# Altium footprint library BluetoothAdapter.PcbLib: 39 footprints (part 2 of 3)
Each footprint in its own frame and in the unit in brackets; x right, y up, seen from the top. Pads: shape width x height; smd on the part's side, far side on the other; paste and mask are expansions set on the pad; w line width, h text height; cw(c..) or ccw(c..) is an arc to the next point about the centre after c.
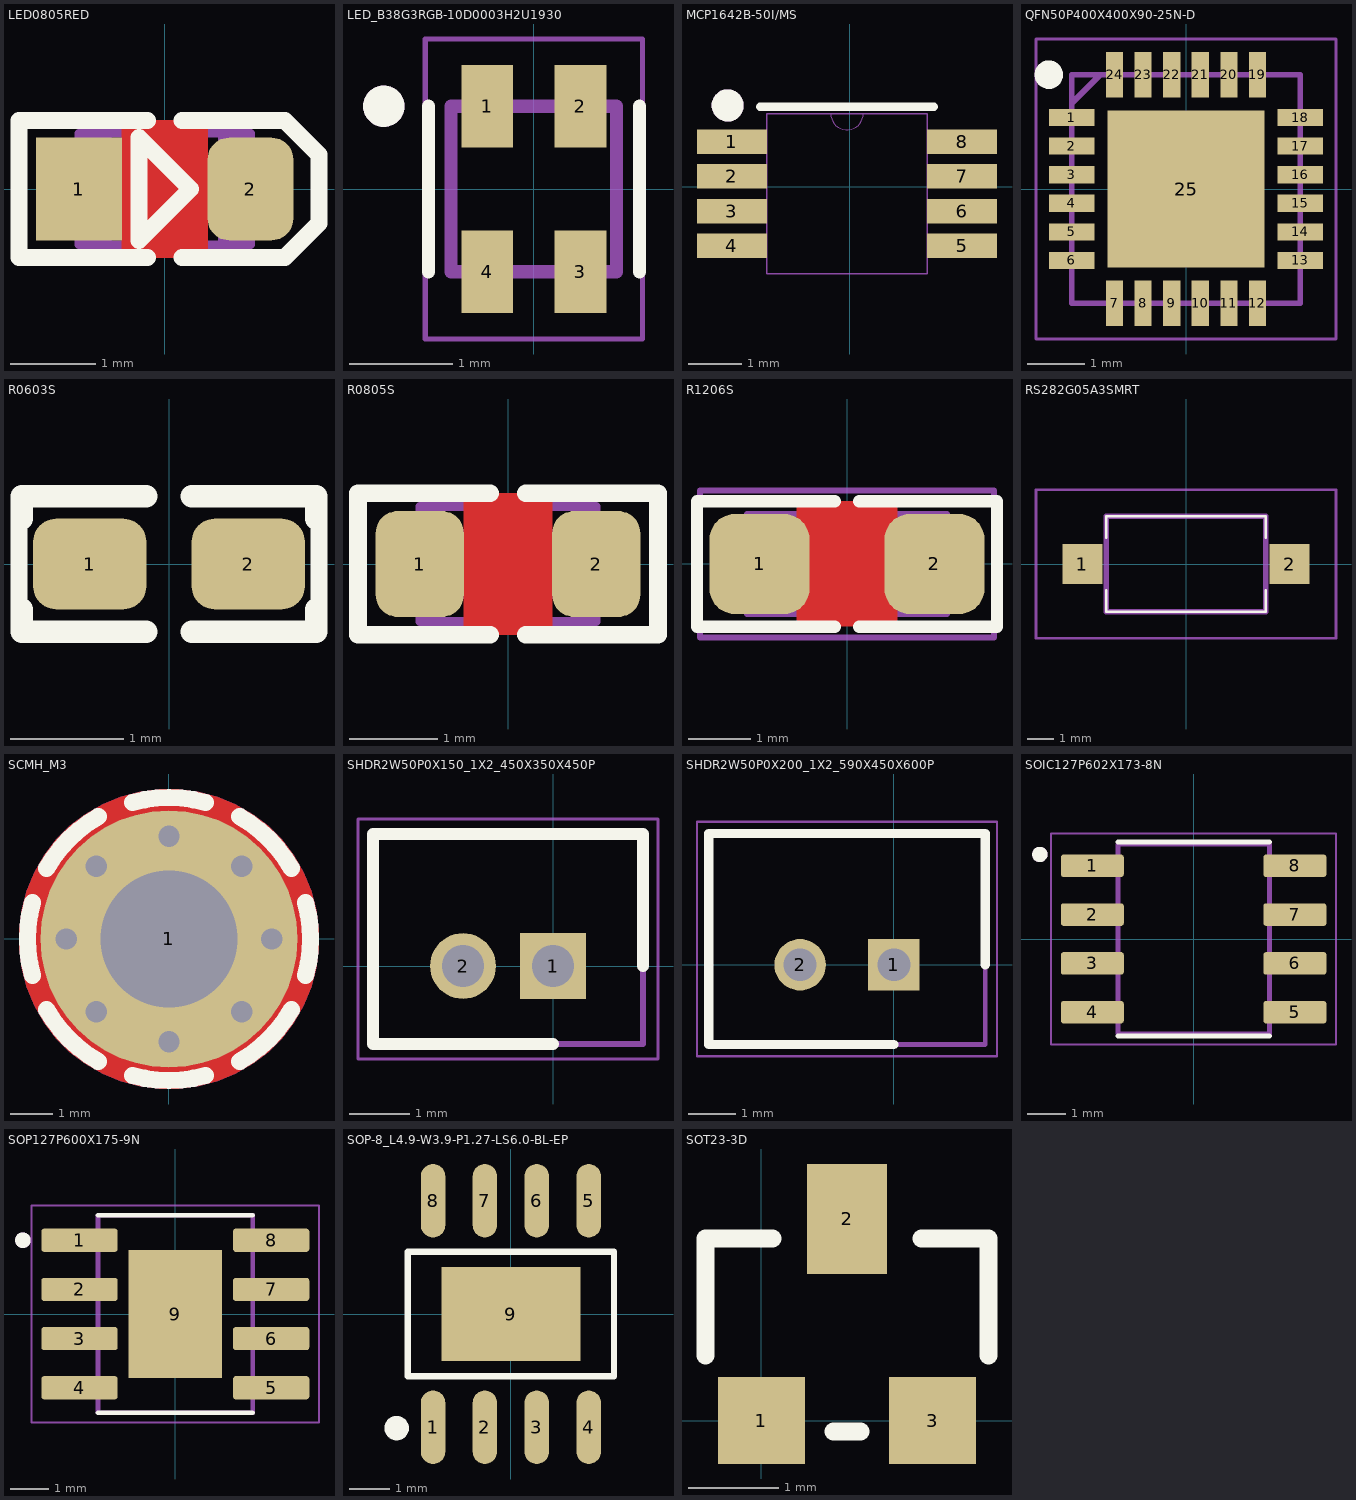
[diagram p1: the footprints below, top view; thin cyan lines are the x and y axes]

## LED0805RED [mm] "LED SMD 0805, RED"
height 1.4
pads (2):
  rect 1x1.2 smd mask+0.075: 1(-1,0)
  rrect50% 1x1.2 smd mask+0.075: 2(1,0)
Top Layer:
  pour cut-out: -0.5,0.8 0.5,0.8 0.5,-0.8 -0.5,-0.8
Top Overlay:
  lines w0.2: -0.2,-0.8 -1.7,-0.8 -1.7,0.8 -0.2,0.8 ; 0.2,-0.8 1.4,-0.8 1.8,-0.4 1.8,0.4 1.4,0.8 0.2,0.8 ; -0.3,-0.6 0.3,0 -0.3,0.6 -0.3,-0.6
Mechanical 13:
  region: 0.995,-0.191 0.842,-0.191 0.842,-0.65 0.995,-0.65
  region: 0.995,0.65 0.842,0.65 0.842,0.19 0.995,0.19
  region: 0.848,0.65 0.619,0.65 0.619,-0.65 0.848,-0.65
  rectangle: -0.995,-0.65 -0.842,-0.19
  rectangle: -0.995,0.191 -0.842,0.65
  rectangle: -0.848,-0.65 -0.619,0.65
  lines w0.102: -0.305,0.356 -0.076,0.025 -0.33,0 -0.076,-0.33 ; 0.102,0.356 0.33,0.025 0.076,0 0.33,-0.33 ; -0.076,-0.33 -0.229,-0.279 -0.076,-0.178 -0.076,-0.33 ; 0.33,-0.33 0.178,-0.279 0.33,-0.178 0.33,-0.33 ; -1,-0.65 -1,-0.191 ccw(c-1,0) -1,0.191 -1,0.65 1,0.65 1,0.191 ccw(c1,0) 1,-0.191 1,-0.65 -1,-0.65
3D body "User Library-Wurth Elektronik WL-SMCW 0805 (2012) LED Lens (Separate Body).step": height 0.7, standoff 0.3, extent -0.7,-0.625 0.7,0.625
3D body "User Library-Wurth Elektronik WL-SMCW 0805 (2012) LED Base (Separate Lens).step": height 0.64, standoff 0, extent -1,-0.625 1,0.625

## LED_B38G3RGB-10D0003H2U1930 [mm]
pads (4):
  rect 0.5x0.8 smd: 1(-0.45,0.8) 2(0.45,0.8) 3(0.45,-0.8) 4(-0.45,-0.8)
Top Overlay:
  circle w0.2: c-1.45,0.8 r0.1
  lines w0.127: -1.02,-0.8 -1.02,0.8 ; 1.02,-0.8 1.02,0.8
Mechanical 13:
  circle w0.2: c-1.45,0.8 r0.1
  lines w0.127: -0.8,-0.8 0.8,-0.8 0.8,0.8 -0.8,0.8 -0.8,-0.8
Mechanical 15:
  lines w0.05: -1.05,-1.45 1.05,-1.45 1.05,1.45 -1.05,1.45 -1.05,-1.45
3D body "step_temp.STEP": height 0.4, standoff 0, extent -0.8,-0.8 0.8,0.8

## MCP1642B-50I/MS [mil]
height 70.87
pads (8):
  rect 51.46x18 smd paste+0 mask+0: 1(-86.85,33.39) 2(-86.85,7.8) 3(-86.85,-17.8) 4(-86.85,-43.39) 5(82.6,-43.39) 6(82.6,-17.8) 7(82.6,7.8) 8(82.6,33.39)
Top Overlay:
  circle w11.81: c-90,60 r5.91
  lines w6: -66.13,59 61.87,59
Mechanical 13:
  circle w11.81: c-90,60 r5.91
  lines w0: -14.13,54 ccw(c-2.13,54) 9.87,54
  lines w1: -98.58,-51.39 -98.58,-35.39 -61.13,-35.39 -61.13,-51.39 -98.58,-51.39 ; -98.58,-25.8 -98.58,-9.8 -61.13,-9.8 -61.13,-25.8 -98.58,-25.8 ; -98.58,-0.2 -98.58,15.8 -61.13,15.8 -61.13,-0.2 -98.58,-0.2 ; -98.58,25.39 -98.58,41.39 -61.13,41.39 -61.13,25.39 -98.58,25.39 ; -61.13,-64 56.87,-64 56.87,54 -61.13,54 -61.13,-64 ; 56.87,-51.39 56.87,-35.39 94.33,-35.39 94.33,-51.39 56.87,-51.39 ; 56.87,-25.8 56.87,-9.8 94.33,-9.8 94.33,-25.8 56.87,-25.8 ; 56.87,-0.2 56.87,15.8 94.33,15.8 94.33,-0.2 56.87,-0.2 ; 56.87,25.39 56.87,41.39 94.33,41.39 94.33,25.39 56.87,25.39
3D body: height 10, standoff 0, extent -2.13,-5 7.87,5
3D body "MSOP8_MCP1642B-50IMS_MCH.step": height 43.11, standoff 0, extent -96.45,-62.95 96.46,55.08

## PRT-13854 [mm]
3D body: height 7, standoff 0.8, extent -20.196,-18.997 22.804,15.003

## QFN50P400X400X90-25N-D [mm]
pads (25):
  rect 0.8x0.3 smd: 1(-2,1.25) 2(-2,0.75) 3(-2,0.25) 4(-2,-0.25) 5(-2,-0.75) 6(-2,-1.25) 13(2,-1.25) 14(2,-0.75) 15(2,-0.25) 16(2,0.25) 17(2,0.75) 18(2,1.25)
  rect 0.3x0.8 smd: 7(-1.25,-2) 8(-0.75,-2) 9(-0.25,-2) 10(0.25,-2) 11(0.75,-2) 12(1.25,-2) 19(1.25,2) 20(0.75,2) 21(0.25,2) 22(-0.25,2) 23(-0.75,2) 24(-1.25,2)
  rect 2.75x2.75 smd: 25(0,0)
Top Overlay:
  circle w0.25: c-2.4,2 r0.125
Mechanical 13:
  lines w0.1: -2,1.5 -1.5,2 ; -2,-2 -2,2 2,2 2,-2 -2,-2
Mechanical 15:
  lines w0.05: -2.625,-2.625 -2.625,2.625 2.625,2.625 2.625,-2.625 -2.625,-2.625
3D body "ATTINY3217-MNR.stp": height 0.9, standoff 0, extent -2.05,-2.05 2.05,2.05

## R0603S [mm] "CHIP Resistor 1/10 WATT, 1.6x0.8mm, 0603, 1608, soldered"
height 0.6
pads (2):
  rrect50% 1x0.8 smd mask+0.05: 1(-0.7,0) 2(0.7,0)
Top Overlay:
  lines w0.15: -1.325,-0.4 -1.325,0.4 ; 1.325,-0.4 1.325,0.4
  lines w0.2: -1.3,-0.4 -1.3,-0.6 -0.2,-0.6 ; -1.3,0.4 -1.3,0.6 -0.2,0.6 ; 0.2,-0.6 1.3,-0.6 1.3,-0.4 ; 0.2,0.6 1.3,0.6 1.3,0.4
3D body "r0603_Res1-1.step": height 0.8, standoff 0, extent -1.23,-0.4 1.23,0.4

## R0805S [mm] "CHIP RESISTOR 1/8 WATT ,2.0X1.3mm, 0805, 2012, soldered"
pads (2):
  rrect50% 1x1.2 smd mask+0.05: 1(-1,0) 2(1,0)
Top Layer:
  pour cut-out: -0.5,0.8 0.5,0.8 0.5,-0.8 -0.5,-0.8
Top Overlay:
  lines w0.2: -0.2,-0.8 -1.7,-0.8 -1.7,0.8 -0.2,0.8 ; 0.2,-0.8 1.7,-0.8 1.7,0.8 0.2,0.8
Mechanical 13:
  lines w0.1: -1,-0.65 1,-0.65 1,0.65 -1,0.65 -1,-0.65
3D body "r0805_Res1.step": height 0.8, standoff 0, extent -1.4,-0.625 1.4,0.625

## R1206S [mm] "CHIP RESISTOR 1/4 WATT, Body 3.2x1.6mm,1206, 3216, soldered"
height 2
pads (2):
  rrect50% 1.6x1.6 smd mask+0.075: 1(-1.4,0) 2(1.4,0)
Top Layer:
  pour cut-out: -0.8,1 -0.8,-1 0.8,-1 0.8,1
Top Overlay:
  lines w0.2: -2.4,-1 -0.2,-1 ; -2.4,-1 -2.4,1 -0.2,1 ; 0.2,-1 2.4,-1 ; 0.2,1 2.4,1 2.4,-1
Mechanical 13:
  lines w0.1: -1.6,-0.8 -1.6,0.8 1.6,0.8 1.6,-0.8 -1.6,-0.8
Mechanical 15:
  lines w0.1: -0.5,0 0.5,0 ; 0,-0.5 0,0.5 ; -2.35,-1.175 -2.35,1.175 2.35,1.175 2.35,-1.175 -2.35,-1.175
3D body "r1206_Res1.step": height 1.25, standoff 0, extent -2.27,-0.8 2.27,0.8

## RS282G05A3SMRT [mm]
pads (2):
  rect 1.5x1.5 smd: 1(-3.9,0) 2(3.9,0)
Top Overlay:
  lines w0.1: -3,-1 -3,-1.8 3,-1.8 3,-1 ; -3,1 -3,1.8 3,1.8 3,1
Mechanical 13:
  lines w0.2: -3,-1.8 3,-1.8 3,1.8 -3,1.8 -3,-1.8
Mechanical 15:
  lines w0.1: -5.65,-2.8 5.65,-2.8 5.65,2.8 -5.65,2.8 -5.65,-2.8
3D body "RS-282G05A3-SMRT_CNK.step": height 2.49, standoff 0, extent -4.65,-1.803 4.65,1.803

## SCMH_M3 [mm] "SCREW mouting, M3, 3.0mm diameter and 6.0mm PanHead"
height 8
pads (1):
  round 6 / inner round 3.5 / far side round 6 hole 3.2 mask+0.1: 1(0,0)
via 0,2.4 diameter 0.8 hole 0.5
via 0,-2.4 diameter 0.8 hole 0.5
via 1.697,-1.697 diameter 0.8 hole 0.5
via -1.697,1.697 diameter 0.8 hole 0.5
via 2.4,0 diameter 0.8 hole 0.5
via -2.4,0 diameter 0.8 hole 0.5
via 1.697,1.697 diameter 0.8 hole 0.5
via -1.697,-1.697 diameter 0.8 hole 0.5
Top Layer:
  pour cut-out: 0,3.5 -0.229,3.5 -0.684,3.44 -1.127,3.321 -1.551,3.146 -1.949,2.916 -2.313,2.637 -2.637,2.313 -2.916,1.949 -3.146,1.551 -3.321,1.127 -3.44,0.684 -3.5,0.229 -3.5,0 -3.5,-0.229 -3.44,-0.684 -3.321,-1.127 -3.146,-1.551 -2.916,-1.949 -2.637,-2.313 -2.313,-2.637 -1.949,-2.916 -1.551,-3.146 -1.127,-3.321 -0.684,-3.44 -0.229,-3.5 0,-3.5 0.229,-3.5 0.684,-3.44 1.127,-3.321 1.551,-3.146 1.949,-2.916 2.313,-2.637 2.637,-2.313 2.916,-1.949 3.146,-1.551 3.321,-1.127 3.44,-0.684 3.5,-0.229 3.5,0 3.5,0.229 3.44,0.684 3.321,1.127 3.146,1.551 2.916,1.949 2.637,2.313 2.313,2.637 1.949,2.916 1.551,3.146 1.127,3.321 0.684,3.44 0.229,3.5
Bottom Layer:
  pour cut-out: 0,3.5 -0.229,3.5 -0.684,3.44 -1.127,3.321 -1.551,3.146 -1.949,2.916 -2.313,2.637 -2.637,2.313 -2.916,1.949 -3.146,1.551 -3.321,1.127 -3.44,0.684 -3.5,0.229 -3.5,0 -3.5,-0.229 -3.44,-0.684 -3.321,-1.127 -3.146,-1.551 -2.916,-1.949 -2.637,-2.313 -2.313,-2.637 -1.949,-2.916 -1.551,-3.146 -1.127,-3.321 -0.684,-3.44 -0.229,-3.5 0,-3.5 0.229,-3.5 0.684,-3.44 1.127,-3.321 1.551,-3.146 1.949,-2.916 2.313,-2.637 2.637,-2.313 2.916,-1.949 3.146,-1.551 3.321,-1.127 3.44,-0.684 3.5,-0.229 3.5,0 3.5,0.229 3.44,0.684 3.321,1.127 3.146,1.551 2.916,1.949 2.637,2.313 2.313,2.637 1.949,2.916 1.551,3.146 1.127,3.321 0.684,3.44 0.229,3.5
Top Overlay:
  lines w0.4: -3.188,-0.854 cw(c0,0) -3.188,0.854 ; -2.858,-1.65 ccw(c0,0) -1.65,-2.858 ; -2.858,1.65 cw(c0,0) -1.65,2.858 ; -0.854,-3.188 ccw(c0,0) 0.854,-3.188 ; -0.854,3.188 cw(c0,0) 0.854,3.188 ; 1.65,-2.858 ccw(c0,0) 2.858,-1.65 ; 1.65,2.858 cw(c0,0) 2.858,1.65 ; 3.188,-0.854 ccw(c0,0) 3.188,0.854

## SHDR2W50P0X150_1X2_450X350X450P [mm]
pads (2):
  rect 1.1x1.1 hole 0.7: 1(0,0)
  round 1.1 hole 0.7: 2(-1.5,0)
Top Overlay:
  lines w0.2: 0,-1.3 -3,-1.3 -3,2.2 1.5,2.2 1.5,0
Mechanical 13:
  lines w0.1: -3,-1.3 1.5,-1.3 1.5,2.2 -3,2.2 -3,-1.3
Mechanical 15:
  lines w0.05: -3.25,-1.55 1.75,-1.55 1.75,2.45 -3.25,2.45 -3.25,-1.55
3D body "Conn_JST_B2B-ZR_LF_SN_eec.STEP": height 4.5, standoff -2.7, extent -3.007,-1.323 1.493,2.177

## SHDR2W50P0X200_1X2_590X450X600P [mm]
pads (2):
  rect 1.1x1.1 / inner round 1.1 / far side rect 1.1x1.1 hole 0.7: 1(0,0)
  round 1.1 hole 0.7: 2(-2,0)
Top Overlay:
  lines w0.2: 0,-1.7 -3.95,-1.7 -3.95,2.8 1.95,2.8 1.95,0
Mechanical 15:
  lines w0.1: -3.95,-1.7 1.95,-1.7 1.95,2.8 -3.95,2.8 -3.95,-1.7
Mechanical 20:
  lines w0.05: -4.2,-1.95 2.2,-1.95 2.2,3.05 -4.2,3.05 -4.2,-1.95
3D body "B2B-PH-K-S.step": height 3.4, standoff -6, extent -3.95,-1.7 1.95,2.8

## SOIC127P602X173-8N [mm]
pads (8):
  rrect25% 1.64x0.59 smd: 1(-2.635,1.905) 2(-2.635,0.635) 3(-2.635,-0.635) 4(-2.635,-1.905) 5(2.635,-1.905) 6(2.635,-0.635) 7(2.635,0.635) 8(2.635,1.905)
Top Overlay:
  circle w0.2: c-4,2.2 r0.1
  lines w0.127: -1.97,-2.52 1.97,-2.52 ; -1.97,2.52 1.97,2.52
Mechanical 13:
  circle w0.2: c-4,2.2 r0.1
  lines w0.127: -1.97,-2.465 1.97,-2.465 1.97,2.465 -1.97,2.465 -1.97,-2.465
Mechanical 15:
  lines w0.05: -3.705,-2.74 3.705,-2.74 3.705,2.74 -3.705,2.74 -3.705,-2.74
3D body: height 1.66, standoff 1.63, extent -1.351,1.601 -0.753,2.199
3D body "D0008A.stp": height 1.63, standoff 0, extent -2.989,-2.426 3.033,2.476

## SOP127P600X175-9N [mm]
pads (9):
  rrect25% 1.97x0.6 smd: 1(-2.475,1.905) 2(-2.475,0.635) 3(-2.475,-0.635) 4(-2.475,-1.905) 5(2.475,-1.905) 6(2.475,-0.635) 7(2.475,0.635) 8(2.475,1.905)
  rect 2.413x3.302 smd paste-3: 9(0,0)
Top Overlay:
  circle w0.2: c-3.937,1.905 r0.1
  lines w0.127: -2,-2.55 2,-2.55 ; -2,2.55 2,2.55
Mechanical 13:
  circle w0.2: c-3.937,1.905 r0.1
  lines w0.127: -2,-2.55 -2,2.55 2,2.55 2,-2.55 -2,-2.55
Mechanical 15:
  lines w0.05: -3.71,-2.8 -3.71,2.8 3.71,2.8 3.71,-2.8 -3.71,-2.8
3D body "step_temp.STEP": height 1.7, standoff 0, extent -3,-2.45 3,2.45

## SOP-8_L4.9-W3.9-P1.27-LS6.0-BL-EP [mm]
pads (9):
  oval 0.6x1.8 smd: 1(-1.905,-2.773) 2(-0.635,-2.773) 3(0.635,-2.773) 4(1.905,-2.773) 5(1.905,2.773) 6(0.635,2.773) 7(-0.635,2.773) 8(-1.905,2.773)
  rect 3.4x2.29 smd: 9(0,0)
Top Overlay:
  circle w0.3: c-2.794,-2.794 r0.15
  lines w0.152: -2.526,-1.521 2.526,-1.521 2.526,1.521 -2.526,1.521 -2.526,-1.521
3D body "step_temp.STEP": height 1.7, standoff 0, extent -2.45,-3 2.45,3

## SOT23-3D [mm]
pads (3):
  rect 0.965x0.965 smd: 1(0,0) 3(1.9,0)
  rect 0.889x1.219 smd: 2(0.95,2.24)
Top Overlay:
  lines w0.2: -0.62,0.72 -0.62,2.02 0.125,2.02 ; 0.8,-0.119 1.1,-0.119 ; 1.775,2.02 2.52,2.02 2.52,0.72
3D body "DBZ0003A.stp": height 1, standoff 0, extent -0.51,-0.15 2.41,2.39